# Altium footprint library Lib.PcbLib: 177 footprints (part 6 of 12)
Each footprint in its own frame and in the unit in brackets; x right, y up, seen from the top. Pads: shape width x height; smd on the part's side, far side on the other; paste and mask are expansions set on the pad; w line width, h text height; cw(c..) or ccw(c..) is an arc to the next point about the centre after c.
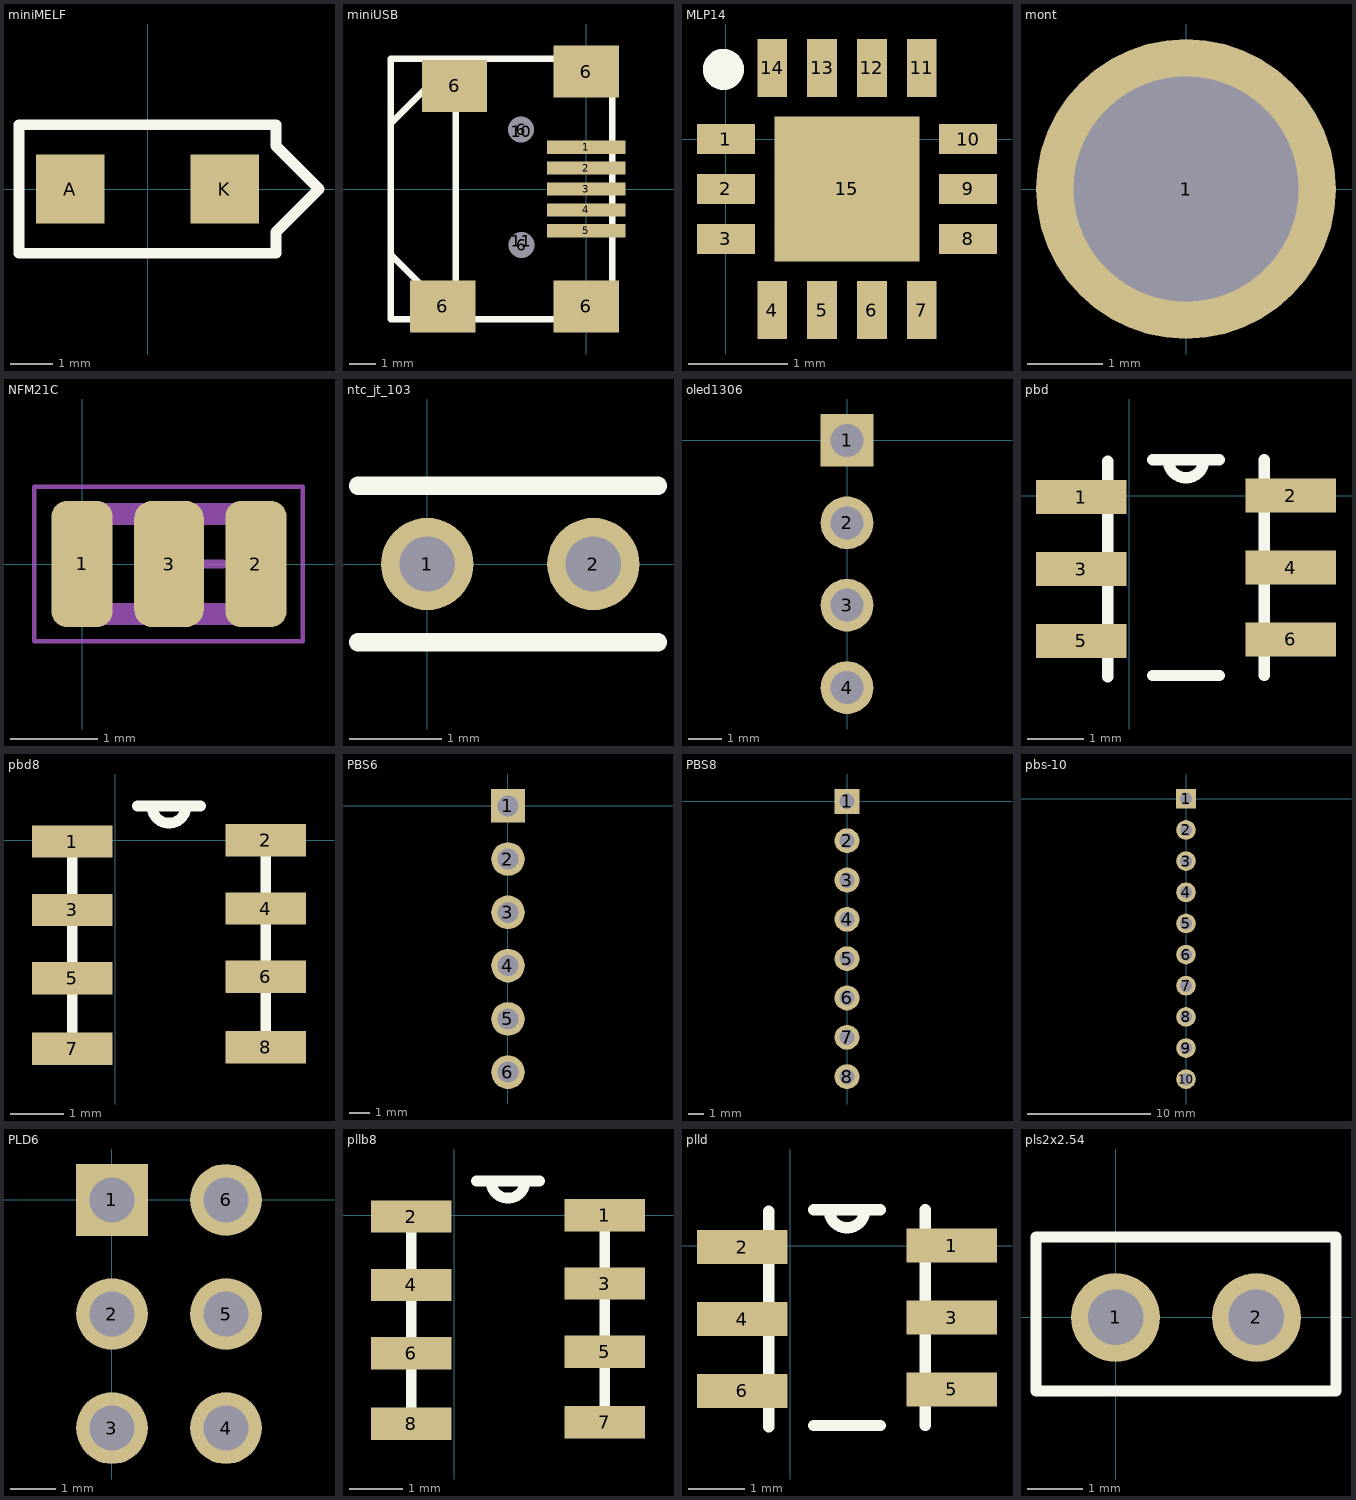
[diagram p5: the footprints below, top view; thin cyan lines are the x and y axes]

## miniMELF [mm]
pads (2):
  rect 1.6x1.6 smd: A(-1.8,0) K(1.8,0)
Top Overlay:
  lines w0.254: -3,-1.5 -3,1.5 3,1.5 3,1 4,0 3,-1 3,-1.5 -3,-1.5

## miniUSB [mm]
height 3
pads (13):
  rect 3x0.5 smd: 1(0,1.6) 2(0,0.8) 3(0,0) 4(0,-0.8) 5(0,-1.6)
  rect 2.5x2 smd: 6(-5.5,-4.5) 6(-5.05,3.95) 6(0,-4.5) 6(0,4.5)
  round 0.8 hole 1: 6(-2.5,2.275) 6(-2.475,-2.15)
  round 1 on Drill Guide: 10(-2.5,2.2) 11(-2.5,-2)
Top Overlay:
  lines w0.254: -7.5,-5 -7.5,5 1,5 1,-5 -7.5,-5 ; -7.5,-2.5 -7.5,2.5 -5,5 -5,-5 -7.5,-2.5
3D body "usb_a-usb_b-m5-smd-c.stp": height 3.98, standoff -0.95, extent -8.375,-4.875 0.875,5.025

## MLP14 [mm]
pads (15):
  rect 0.58x0.3 smd: 1(0,0) 2(0,-0.5) 3(0,-1) 8(2.43,-1) 9(2.43,-0.5) 10(2.43,0)
  rect 0.3x0.58 smd: 4(0.465,-1.715) 5(0.965,-1.715) 6(1.465,-1.715) 7(1.965,-1.715) 11(1.965,0.715) 12(1.465,0.715) 13(0.965,0.715) 14(0.465,0.715)
  rect 1.45x1.45 smd: 15(1.215,-0.5)
Top Overlay:
  circle w0.254: c-0.025,0.7 r0.079
3D body: height 0.7, standoff 0, extent -0.03,-1.748 2.46,0.748

## mont [mm]
pads (1):
  round 4 hole 3: 1(0,0)

## NFM21C [mm]
height 0.95
pads (3):
  rrect50% 0.7x1.45 smd: 1(0,0) 2(2,0)
  rrect50% 0.8x1.45 smd: 3(1,0)
Mechanical 3:
  lines w0.254: 0.025,-0.575 0.025,0.575 2.032,0.575 2.032,-0.575 0.025,-0.575
Mechanical 13:
  lines w0.1: 0.15,-0.625 1.905,-0.625 1.905,0.625 0.15,0.625 0.15,-0.625
Mechanical 15:
  lines w0.05: -0.55,-0.889 -0.55,0.889 2.54,0.889 2.54,-0.889 -0.55,-0.889
  lines w0.1: 0.675,0 1.625,0 ; 1.15,-0.475 1.15,0.475
3D body "User Library-Murata_NFM21C.STEP": height 0.85, standoff 0, extent 0.016,-0.625 2.016,0.625

## ntc_jt_103 [mm]
pads (2):
  round 1 hole 0.6: 1(0,0) 2(1.8,0)
Top Overlay:
  lines w0.2: -0.75,-0.85 2.5,-0.85 ; -0.75,0.85 2.5,0.85

## oled1306 [mm]
pads (4):
  rect 1.6x1.6 hole 1: 1(0,0)
  round 1.6 hole 1: 2(0,-2.5) 3(0,-5) 4(0,-7.5)
3D body "OLED_27x27.STEP": height 13, standoff 2, extent -1.8,-17.3 25.5,10

## pbd [mm]
pads (6):
  rect 1.6x0.6 smd: 1(-0.85,-0.025) 2(2.85,0) 3(-0.85,-1.295) 4(2.85,-1.27) 5(-0.85,-2.565) 6(2.85,-2.54)
Top Overlay:
  lines w0.2: -0.385,-3.2 -0.385,0.61 ; 0.415,-3.175 1.585,-3.175 ; 0.415,0.635 1.318,0.635 cw(c1,0.635) 0.683,0.635 1.585,0.635 ; 2.385,-3.175 2.385,0.635
3D body "User Library-PBD1_27-xx-S.step": height 4.5, standoff 0, extent -1.5,-3.175 3.5,0.635

## pbd8 [mm]
pads (8):
  rect 1.5x0.6 smd: 1(-0.8,-0.025) 2(2.8,0) 3(-0.8,-1.295) 4(2.8,-1.27) 5(-0.8,-2.565) 6(2.8,-2.54) 7(-0.8,-3.875) 8(2.8,-3.85)
Top Overlay:
  lines w0.2: -0.8,-3.875 -0.8,-0.065 ; 0.415,0.635 1.318,0.635 cw(c1,0.635) 0.683,0.635 1.585,0.635 ; 2.8,-3.85 2.8,-0.04
3D body "User Library-PBD1_27-xx-SPBD1_27-8-S.STEP": height 4.5, standoff 0, extent -1.525,-4.47 3.475,0.61

## PBS6 [mm]
pads (6):
  rect 1.6x1.6 hole 1: 1(0,0)
  round 1.6 hole 1: 2(0,-2.54) 3(0,-5.08) 4(0,-7.62) 5(0,-10.16) 6(0,-12.7)
3D body "User Library-PBS-06.step": height 8.4, standoff -3.2, extent -1.25,-13.97 1.29,1.27

## PBS8 [mm]
pads (8):
  rect 1.6x1.6 hole 1: 1(0,0)
  round 1.6 hole 1: 2(0,-2.54) 3(0,-5.08) 4(0,-7.62) 5(0,-10.16) 6(0,-12.7) 7(0,-15.24) 8(0,-17.78)
3D body "User Library-PBS-08.step": height 8.4, standoff -3.2, extent -1.375,-19.06 1.165,1.26

## pbs-10 [mm]
pads (10):
  rect 1.6x1.6 hole 1: 1(0,0)
  round 1.6 hole 1: 2(0,-2.54) 3(0,-5.08) 4(0,-7.62) 5(0,-10.16) 6(0,-12.7) 7(0,-15.24) 8(0,-17.78) 9(0,-20.32) 10(0,-22.86)
3D body "User Library-PBS-10.step": height 8.4, standoff -3.2, extent -1.24,-24.025 1.3,1.375

## PLD6 [mm]
pads (6):
  rect 1.6x1.6 hole 1: 1(0,0)
  round 1.6 hole 1: 2(0,-2.54) 3(0,-5.08) 4(2.54,-5.08) 5(2.54,-2.54) 6(2.54,0)
3D body "User Library-PLD-6.step": height 8.5, standoff -3, extent -1.15,-6.29 3.85,1.33

## pllb8 [mm]
pads (8):
  rect 1.5x0.6 smd: 1(2.8,0) 2(-0.8,-0.025) 3(2.8,-1.27) 4(-0.8,-1.295) 5(2.8,-2.54) 6(-0.8,-2.565) 7(2.8,-3.85) 8(-0.8,-3.875)
Top Overlay:
  lines w0.2: -0.8,-3.875 -0.8,-0.065 ; 0.415,0.635 1.318,0.635 cw(c1,0.635) 0.683,0.635 1.585,0.635 ; 2.8,-3.85 2.8,-0.04
3D body "User Library-PLLD1_27-xx-SPLLD1_27-8-S.STEP": height 3.9, standoff 0, extent -1.5,-4.46 3.5,0.62

## plld [mm]
pads (6):
  rect 1.6x0.6 smd: 1(2.85,0) 2(-0.85,-0.025) 3(2.85,-1.27) 4(-0.85,-1.295) 5(2.85,-2.54) 6(-0.85,-2.565)
Top Overlay:
  lines w0.2: -0.385,-3.2 -0.385,0.61 ; 0.415,-3.175 1.585,-3.175 ; 0.415,0.635 1.318,0.635 cw(c1,0.635) 0.683,0.635 1.585,0.635 ; 2.385,-3.175 2.385,0.635
3D body "User Library-PLLD1_27-xx-S.step": height 3.9, standoff 0, extent -1.5,-3.135 3.5,0.675

## pls2x2.54 [mm]
pads (2):
  round 1.6 hole 1: 1(0,0) 2(2.54,0)
Top Overlay:
  lines w0.2: -1.435,-1.325 -1.435,1.45 3.975,1.45 3.975,0 3.975,-1.325 -1.435,-1.325
3D body "User Library-PLS-2.step": height 8.54, standoff -3, extent -1.28,-1.215 3.8,1.325